# Altium footprint library tik_handheld_pcblib.PcbLib: 46 footprints (part 1 of 3)
Each footprint in its own frame and in the unit in brackets; x right, y up, seen from the top. Pads: shape width x height; smd on the part's side, far side on the other; paste and mask are expansions set on the pad; w line width, h text height; cw(c..) or ccw(c..) is an arc to the next point about the centre after c.
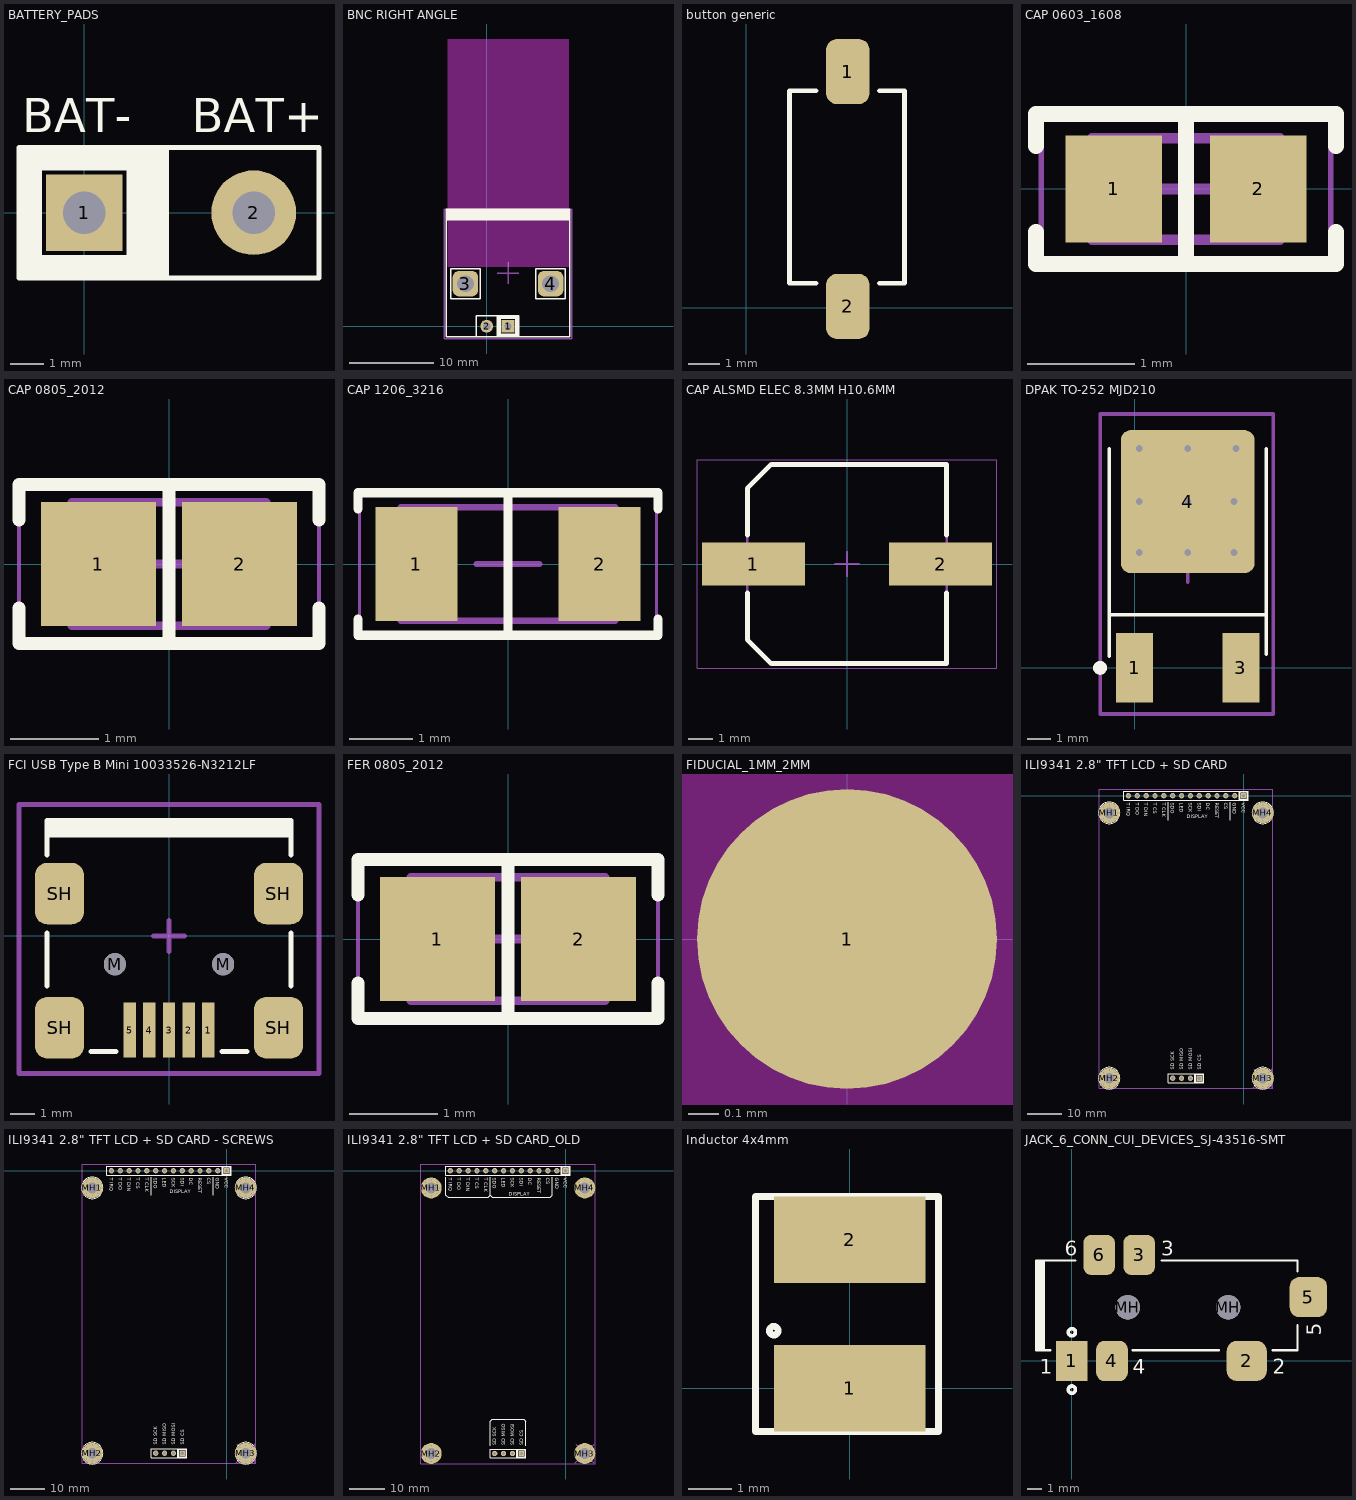
[diagram p0: the footprints below, top view; thin cyan lines are the x and y axes]

## BATTERY_PADS [mil]
pads (2):
  rect 90x90 hole 50 mask+5: 1(0,0)
  round 100 hole 50 mask+5: 2(200,0)
Top Overlay:
  rectangle: -77,-77 75,-50
  rectangle: 50,-79 100,77
  rectangle: -77,-79 -50,75
  rectangle: -77,50 75,77
  lines w6: -77,-77 277,-77 277,77 -77,77 -77,-77
  text "BAT+" at 126.69,95.01 h40
  text "BAT-" at -73.31,95.01 h40
Bottom Overlay:
  rectangle: -77,-77 75,-50
  rectangle: 50,-79 100,77
  rectangle: -77,-79 -50,75
  rectangle: -77,50 75,77
  lines w6: -77,-77 277,-77 277,77 -77,77 -77,-77
  text "BAT+" at 273.31,95.01 h40
  text "BAT-" at 73.31,95.01 h40

## BNC RIGHT ANGLE [mil] "BNC JACK RIGHT ANGLE PCB MOUNT ZINC DIE CAST"
pads (4):
  rect 60x60 hole 35: 1(100,0)
  round 60 hole 35: 2(0,0)
  rrect50% 120x120 hole 79: 3(-100,200) 4(300,200)
Top Overlay:
  rectangle: -190,500 390,550
  rectangle: 50,34 150,50
  region: 66,-50 66,50 50,50 50,-50
  region: 134,50 134,-50 150,-50 150,50
  region: 150,-34 50,-34 50,-50 150,-50
  lines w6: -190,500 390,500 ; 50,-50 150,-50 ; 50,-50 50,50 ; 50,-50 -50,-50 -50,50 50,50 ; 50,-50 50,50 ; 50,-50 150,-50 ; 50,50 150,50 150,-50 ; -190,-50 390,-50 390,550 -190,550 -190,-50 ; -170,130 -30,130 -30,270 -170,270 -170,130 ; 230,130 370,130 370,270 230,270 230,130
Bottom Overlay:
  region: 134,50 134,-50 150,-50 150,50
  rectangle: 50,34 150,50
  region: 66,-50 66,50 50,50 50,-50
  region: 150,-34 50,-34 50,-50 150,-50
  lines w6: 50,-50 -50,-50 -50,50 50,50 ; 50,-50 50,50 ; 50,-50 150,-50 150,50 50,50 ; 50,-50 50,50 ; -170,130 -30,130 -30,270 -170,270 -170,130 ; 230,130 370,130 370,270 230,270 230,130
  text "+" at 80,-66 h40
  text "-" at -19.99,-66 h40
Keep-Out Layer:
  rectangle: -185.04,279.53 385.83,1350
Mechanical 13:
  text "BNC / CONNECTOR" at 212.8,617.82 h60
Mechanical 15:
  lines w6: 50,250 150,250 ; 100,200 100,300 ; -200,-60 400,-60 400,550 -200,550 -200,-60
3D body "31-71043_1.stp": height 514.84, standoff -185.45, extent -183.5,-47.02 383.5,1347.01

## button generic [mm] "SMD Push Buttom Tact"
pads (2):
  rrect50% 1.4x2.1 smd: 1(3.277,7.62) 2(3.277,0.051)
Top Overlay:
  lines w0.152: 2.25,0.8 1.4,0.8 1.4,7 2.25,7 ; 4.3,0.8 5.1,0.8 5.1,7 4.3,7
3D body "Tactile Switch SMD 6x3.6mm H=2.5mm RS-282G05A3-SM RT.stp": height 2.5, standoff -0.02, extent 1.477,-0.114 5.077,7.886

## CAP 0603_1608 [mm] "Chip Capacitor, 2-Leads, Body 1.60x0.80mm, IPC Medium Density"
height 0.89
pads (2):
  rect 0.9x1 smd: 1(-0.675,0) 2(0.675,0)
Top Overlay:
  lines w0.15: -1.4,-0.4 -1.4,-0.7 1.4,-0.7 1.4,-0.4 ; -1.4,0.4 -1.4,0.7 1.4,0.7 1.4,0.4 ; 0,-0.7 0,0.7
Mechanical 13:
  lines w0.1: -0.875,-0.475 -0.875,0.475 0.875,0.475 0.875,-0.475 -0.875,-0.475
Mechanical 15:
  lines w0.05: -1.35,-0.75 -1.35,0.75 1.35,0.75 1.35,-0.75 -1.35,-0.75
  lines w0.1: -0.475,0 0.475,0 ; 0,-0.475 0,0.475
3D body "0603 cap.STEP": height 0.82, standoff 0, extent -0.8,-0.412 0.8,0.412

## CAP 0805_2012 [mm] "Chip Capacitor, 2-Leads, Body 2.00x1.20mm, IPC Medium Density"
height 1.15
pads (2):
  rect 1.3x1.4 smd: 1(-0.8,0) 2(0.8,0)
Top Overlay:
  lines w0.15: -1.7,-0.5 -1.7,-0.9 1.7,-0.9 1.7,-0.5 ; -1.7,0.5 -1.7,0.9 1.7,0.9 1.7,0.5 ; 0,-0.9 0,0.9
Mechanical 13:
  lines w0.1: -1.1,-0.7 1.1,-0.7 1.1,0.7 -1.1,0.7 -1.1,-0.7
Mechanical 15:
  lines w0.05: -1.7,-0.95 1.7,-0.95 1.7,0.95 -1.7,0.95 -1.7,-0.95
  lines w0.1: -0.5,0 0.5,0 ; 0,-0.5 0,0.5
3D body "0805 cap.STEP": height 1.26, standoff -0.02, extent -1,-0.637 1,0.637

## CAP 1206_3216 [mm] "Chip Capacitor, 2-Leads, Body 3.25x1.60mm, IPC Medium Density"
height 1
pads (2):
  rect 1.3x1.8 smd: 1(-1.45,0) 2(1.45,0)
Top Overlay:
  lines w0.15: -2.375,-0.875 -2.375,-1.125 2.375,-1.125 2.375,-0.875 ; -2.375,0.875 -2.375,1.125 2.375,1.125 2.375,0.875 ; 0,-1.125 0,1.125
Mechanical 13:
  lines w0.1: -1.7,-0.9 1.7,-0.9 1.7,0.9 -1.7,0.9 -1.7,-0.9
Mechanical 15:
  lines w0.05: -2.35,-1.15 2.35,-1.15 2.35,1.15 -2.35,1.15 -2.35,-1.15
  lines w0.1: -0.5,0 0.5,0 ; 0,-0.5 0,0.5
3D body "CAP 1206-1mm.STEP": height 1, standoff 0, extent -1.6,-0.8 1.6,0.8

## CAP ALSMD ELEC 8.3MM H10.6MM [mm] "Aluminum SMD Electrolytic Capacitor, 8.30mm Land Size, 8.00mm Diameter, 10.60mm Height, 10.00mm Maximum Leads Span"
height 0.9
pads (2):
  rect 4.3x1.8 smd: 1(-3.9,0) 2(3.9,0)
Top Overlay:
  lines w0.2: -4.15,-1.2 -4.15,-3.15 -3.15,-4.15 4.15,-4.15 4.15,-1.2 ; -4.15,1.2 -4.15,3.15 -3.15,4.15 4.15,4.15 4.15,1.2
Mechanical 13:
  lines w0.1: -4.15,-3.15 -4.15,3.15 -3.15,4.15 4.15,4.15 4.15,-4.15 -3.15,-4.15 -4.15,-3.15
Mechanical 15:
  lines w0.05: -6.25,-4.35 -6.25,4.35 6.25,4.35 6.25,-4.35 -6.25,-4.35
  lines w0.1: -0.5,0 0.5,0 ; 0,-0.5 0,0.5
3D body ".STEP": height 10.6, standoff 0, extent -5,-4.15 5,4.15

## DPAK TO-252 MJD210 [mm]
pads (3):
  rect 1.6x3 smd: 1(0,0) 3(4.6,0)
  rrect15% 5.8x6.2 smd: 4(2.3,7.2)
via 2.3,7.2 diameter 0.6 hole 0.3
via 2.3,5 diameter 0.6 hole 0.3
via 0.2,5 diameter 0.6 hole 0.3
via 4.3,5 diameter 0.6 hole 0.3
via 4.3,7.2 diameter 0.6 hole 0.3
via 4.4,9.5 diameter 0.6 hole 0.3
via 2.3,9.5 diameter 0.6 hole 0.3
via 0.2,7.2 diameter 0.6 hole 0.3
via 0.2,9.5 diameter 0.6 hole 0.3
Top Overlay:
  circle w0.3: c-1.5,0 r0.15
  lines w0.152: -1.1,0.5 -1.1,9.5 ; -1.1,2.3 5.7,2.3 ; 5.7,0.6 5.7,9.5
Mechanical 15:
  lines w0.152: 1.5,4.5 3.1,4.5 ; 2.3,3.7 2.3,5.3 ; -1.5,-2 6,-2 6,11 -1.5,11 -1.5,-2
3D body "User Library-DPAK_TO-252AA.step": height 2.37, standoff -0.03, extent -1.067,-0.598 5.667,9.502

## FCI USB Type B Mini 10033526-N3212LF [mm] "USB 2.0 Type B Mini"
height 3.95
pads (11):
  rect 0.5x2.25 smd: 1(1.6,-3.826) 2(0.8,-3.826) 3(0,-3.826) 4(-0.8,-3.826) 5(-1.6,-3.826)
  round 0.9 hole 0.9 unplated: M(-2.2,-1.151) M(2.2,-1.151)
  rrect50% 2x2.5 smd: SH(-4.45,-3.731) SH(-4.45,1.719) SH(4.45,-3.731) SH(4.45,1.719)
Top Overlay:
  rectangle: -4.953,3.993 4.953,4.691
  lines w0.2: -4.953,-2.04 -4.953,0.119 ; -4.953,3.294 -4.953,4.691 4.953,4.691 4.953,3.294 ; -3.175,-4.707 -2.159,-4.707 ; 2.159,-4.707 3.175,-4.707 ; 4.953,-2.04 4.953,0.119
Mechanical 15:
  lines w0.2: -0.635,0 0.635,0 ; 0,-0.635 0,0.635 ; -6.096,-5.588 -6.096,5.334 6.096,5.334 6.096,-5.588 -6.096,-5.588
3D body "FCI USB 10033526-N3212LF.STEP": height 4.01, standoff -0.99, extent -4.95,-4.701 4.95,4.699

## FER 0805_2012 [mm] "Chip Ferrite, 2-Leads, Body 2.00x1.20mm, IPC Medium Density"
height 1.15
pads (2):
  rect 1.3x1.4 smd: 1(-0.8,0) 2(0.8,0)
Top Overlay:
  lines w0.15: -1.7,-0.5 -1.7,-0.9 1.7,-0.9 1.7,-0.5 ; -1.7,0.5 -1.7,0.9 1.7,0.9 1.7,0.5 ; 0,-0.9 0,0.9
Mechanical 13:
  lines w0.1: -1.1,-0.7 1.1,-0.7 1.1,0.7 -1.1,0.7 -1.1,-0.7
Mechanical 15:
  lines w0.05: -1.7,-0.95 1.7,-0.95 1.7,0.95 -1.7,0.95 -1.7,-0.95
  lines w0.1: -0.5,0 0.5,0 ; 0,-0.5 0,0.5
3D body "FER 0805.STEP": height 1.26, standoff -0.02, extent -1,-0.637 1,0.637

## FIDUCIAL_1MM_2MM [mm]
pads (1):
  round 1 smd mask+0.5: 1(0,0)
Top Layer keep-out:
  circle w1: c0,0 r0.5

## ILI9341 2.8" TFT LCD + SD CARD [mil]
pads (22):
  rect 60x60 hole 35: 1(0,0) 18(-500,-3188.98)
  round 60 hole 35: 2(-100,0) 3(-200,0) 4(-300,0) 5(-400,0) 6(-500,0) 7(-600,0) 8(-700,0) 9(-800,0) 10(-900,0) 11(-1000,0) 12(-1100,0) 13(-1200,0) 14(-1300,0) 15(-800,-3188.98) 16(-700,-3188.98) 17(-600,-3188.98)
  round 236.22 hole 122.05 paste+0 mask+0: MH1(-1516.14,-193.7) MH2(-1516.14,-3188.98) MH3(216.14,-3188.98) MH4(216.14,-193.7)
via 280.17,-129.67 diameter 23.62 hole 11.81
via 280.17,-257.73 diameter 23.62 hole 11.81
via 152.11,-257.73 diameter 23.62 hole 11.81
via 152.11,-129.67 diameter 23.62 hole 11.81
via 216.54,-284.25 diameter 23.62 hole 11.81
via 307.09,-193.7 diameter 23.62 hole 11.81
via 216.54,-103.15 diameter 23.62 hole 11.81
via 125.98,-193.7 diameter 23.62 hole 11.81
via -1452.11,-129.67 diameter 23.62 hole 11.81
via -1452.11,-257.73 diameter 23.62 hole 11.81
via -1580.17,-257.73 diameter 23.62 hole 11.81
via -1580.17,-129.67 diameter 23.62 hole 11.81
via -1515.75,-284.25 diameter 23.62 hole 11.81
via -1425.2,-193.7 diameter 23.62 hole 11.81
via -1515.75,-103.15 diameter 23.62 hole 11.81
via -1606.3,-193.7 diameter 23.62 hole 11.81
via -1451.72,-3124.95 diameter 23.62 hole 11.81
via -1451.72,-3253.01 diameter 23.62 hole 11.81
via -1579.78,-3253.01 diameter 23.62 hole 11.81
via -1579.78,-3124.95 diameter 23.62 hole 11.81
via -1515.35,-3279.53 diameter 23.62 hole 11.81
via -1424.8,-3188.98 diameter 23.62 hole 11.81
via -1515.35,-3098.43 diameter 23.62 hole 11.81
via -1605.91,-3188.98 diameter 23.62 hole 11.81
via 280.17,-3124.95 diameter 23.62 hole 11.81
via 280.17,-3253.01 diameter 23.62 hole 11.81
via 152.11,-3253.01 diameter 23.62 hole 11.81
via 152.11,-3124.95 diameter 23.62 hole 11.81
via 216.54,-3279.53 diameter 23.62 hole 11.81
via 307.09,-3188.98 diameter 23.62 hole 11.81
via 216.54,-3098.43 diameter 23.62 hole 11.81
via 125.98,-3188.98 diameter 23.62 hole 11.81
Top Overlay:
  circle w6: c-1516.14,-193.7 r121.66
  circle w6: c-1516.14,-3188.98 r121.66
  circle w6: c216.14,-3188.98 r121.66
  circle w6: c216.14,-193.7 r121.66
  rectangle: -550.01,-3153.98 -448.01,-3136.98
  rectangle: -550.01,-3240.98 -448.01,-3223.98
  region: -448.01,-3238.98 -448.01,-3136.98 -465.01,-3136.98 -465.01,-3238.98
  region: -535.01,-3238.98 -535.01,-3136.98 -550.01,-3136.98 -550.01,-3238.98
  rectangle: -50.01,35 51.99,52
  rectangle: -50.01,-52 51.99,-35
  region: 51.99,-50 51.99,52 34.99,52 34.99,-50
  region: -35.01,-50 -35.01,52 -50.01,52 -50.01,-50
  lines w6: -850,-275 -850,-75 ; -550,-3238.19 -550,-3139.76 ; -150,-275 -150,-75 ; -50,-50 -50,50 ; -1350,-50 50,-50 50,50 -1350,50 -1350,-50 ; -850,-3238.98 -450,-3238.98 -450,-3138.98 -850,-3138.98 -850,-3238.98
  text "DISPLAY" at -641.77,-252.68 h40
  text "T IRQ" at -1319.99,-80.98 h40
  text "T DO" at -1219.99,-80.98 h40
  text "T DIN" at -1119.99,-80.98 h40
  text "T CS" at -1019.99,-80.98 h40
  text "T CLK" at -919.99,-80.98 h40
  text "SDO" at -819.99,-80.98 h40
  text "LED" at -719.99,-80.98 h40
  text "SCK" at -619.99,-80.98 h40
  text "SDI" at -519.99,-80.98 h40
  text "DC" at -419.99,-80.98 h40
  text "RESET" at -319.99,-80.98 h40
  text "CS" at -219.99,-80.98 h40
  text "GND" at -119.99,-80.98 h40
  text "VCC" at -19.99,-80.98 h40
  text "SD SCK" at -779.99,-3094 h40
  text "SD MISO" at -679.99,-3094 h40
  text "SD MOSI" at -579.99,-3094 h40
  text "SD CS" at -479.99,-3094 h40
Bottom Overlay:
  circle w6: c-1516.14,-3188.98 r121.66
  circle w6: c216.14,-3188.98 r121.66
  circle w6: c216.14,-193.7 r121.66
  circle w6: c-1516.14,-193.7 r121.66
  rectangle: -550.01,-3153.98 -448.01,-3136.98
  region: -448.01,-3238.98 -448.01,-3136.98 -465.01,-3136.98 -465.01,-3238.98
  rectangle: -550.01,-3240.98 -448.01,-3223.98
  region: -535.01,-3238.98 -535.01,-3136.98 -550.01,-3136.98 -550.01,-3238.98
  rectangle: -50.01,-52 51.99,-35
  rectangle: -50.01,35 51.99,52
  region: 34.99,50 34.99,-52 51.99,-52 51.99,50
  region: -50.01,50 -50.01,-52 -35.01,-52 -35.01,50
  lines w6: -850,-275 -850,-75 ; -550,-3238.19 -550,-3139.76 ; -150,-275 -150,-75 ; -50,-50 -50,50 ; -1350,-50 50,-50 50,50 -1350,50 -1350,-50 ; -850,-3238.98 -450,-3238.98 -450,-3138.98 -850,-3138.98 -850,-3238.98
  text "VCC" at -19.99,-189.04 h40
  text "CS" at -219.99,-149.05 h40
  text "GND" at -119.99,-189.04 h40
  text "T IRQ" at -1319.99,-262.35 h40
  text "DISPLAY" at -381.85,-252.68 h40
  text "T DO" at -1219.99,-229.02 h40
  text "T DIN" at -1119.99,-262.35 h40
  text "T CS" at -1019.99,-229.02 h40
  text "T CLK" at -919.99,-269.01 h40
  text "SDO" at -819.99,-189.04 h40
  text "LED" at -719.99,-189.04 h40
  text "SCK" at -619.99,-189.04 h40
  text "SDI" at -519.99,-175.71 h40
  text "DC" at -419.99,-149.05 h40
  text "RESET" at -319.99,-269.01 h40
  text "SD MOSI" at -579.99,-2840.98 h40
  text "SD CS" at -479.99,-2907.63 h40
  text "SD SCK" at -779.99,-2867.64 h40
  text "SD MISO" at -679.99,-2834.32 h40
Assembly Notes:
  circle w6: c216.14,-3188.98 r90.55
  lines w6: 109.84,-3295.28 216.14,-3188.98 ; 114.17,-3087.01 216.14,-3188.98 ; 318.11,-3290.94 216.14,-3188.98 ; 322.44,-3082.68 216.14,-3188.98
Mechanical 13:
  text "SD CARD READER / IN THIS SIDE" at 214.37,-2125.86 h40
Mechanical 15:
  lines w6: -1631.25,-3304.09 331.25,-3304.09 331.25,75.74 -1631.25,75.74 -1631.25,-3304.09
Drill Drawing:
  circle w6: c-1516.14,-193.7 r90.55
3D body "2.8 TFT Module_mod.STEP": height 493.83, standoff -17.54, extent -1638.35,-3309.1 337.66,72.89
3D body "ROW HEADER low 5mm 1X14PIN.STEP": height 198.82, standoff -76.77, extent -1349.41,-49.8 50.59,50.2
3D body "ROW HEADER low 5mm 1X4PIN.STEP": height 198.82, standoff -76.77, extent -849.61,-3238.78 -449.61,-3138.78

## ILI9341 2.8" TFT LCD + SD CARD - SCREWS [mil]
pads (22):
  rect 60x60 hole 35: 1(0,0) 18(-500,-3188.98)
  round 60 hole 35: 2(-100,0) 3(-200,0) 4(-300,0) 5(-400,0) 6(-500,0) 7(-600,0) 8(-700,0) 9(-800,0) 10(-900,0) 11(-1000,0) 12(-1100,0) 13(-1200,0) 14(-1300,0) 15(-800,-3188.98) 16(-700,-3188.98) 17(-600,-3188.98)
  round 236.22 hole 122.05 paste+0 mask+0: MH1(-1516.14,-193.7) MH2(-1516.14,-3188.98) MH3(216.14,-3188.98) MH4(216.14,-193.7)
via 125.98,-3188.98 diameter 23.62 hole 11.81
via 216.54,-3098.43 diameter 23.62 hole 11.81
via 307.09,-3188.98 diameter 23.62 hole 11.81
via 216.54,-3279.53 diameter 23.62 hole 11.81
via 152.11,-3124.95 diameter 23.62 hole 11.81
via 152.11,-3253.01 diameter 23.62 hole 11.81
via 280.17,-3253.01 diameter 23.62 hole 11.81
via 280.17,-3124.95 diameter 23.62 hole 11.81
via -1605.91,-3188.98 diameter 23.62 hole 11.81
via -1515.35,-3098.43 diameter 23.62 hole 11.81
via -1424.8,-3188.98 diameter 23.62 hole 11.81
via -1515.35,-3279.53 diameter 23.62 hole 11.81
via -1579.78,-3124.95 diameter 23.62 hole 11.81
via -1579.78,-3253.01 diameter 23.62 hole 11.81
via -1451.72,-3253.01 diameter 23.62 hole 11.81
via -1451.72,-3124.95 diameter 23.62 hole 11.81
via -1606.3,-193.7 diameter 23.62 hole 11.81
via -1515.75,-103.15 diameter 23.62 hole 11.81
via -1425.2,-193.7 diameter 23.62 hole 11.81
via -1515.75,-284.25 diameter 23.62 hole 11.81
via -1580.17,-129.67 diameter 23.62 hole 11.81
via -1580.17,-257.73 diameter 23.62 hole 11.81
via -1452.11,-257.73 diameter 23.62 hole 11.81
via -1452.11,-129.67 diameter 23.62 hole 11.81
via 125.98,-193.7 diameter 23.62 hole 11.81
via 216.54,-103.15 diameter 23.62 hole 11.81
via 307.09,-193.7 diameter 23.62 hole 11.81
via 216.54,-284.25 diameter 23.62 hole 11.81
via 152.11,-129.67 diameter 23.62 hole 11.81
via 152.11,-257.73 diameter 23.62 hole 11.81
via 280.17,-257.73 diameter 23.62 hole 11.81
via 280.17,-129.67 diameter 23.62 hole 11.81
Top Overlay:
  circle w6: c216.14,-193.7 r121.66
  circle w6: c216.14,-3188.98 r121.66
  circle w6: c-1516.14,-3188.98 r121.66
  circle w6: c-1516.14,-193.7 r121.66
  region: -35.01,-50 -35.01,52 -50.01,52 -50.01,-50
  region: 51.99,-50 51.99,52 34.99,52 34.99,-50
  rectangle: -50.01,-52 51.99,-35
  rectangle: -50.01,35 51.99,52
  region: -535.01,-3238.98 -535.01,-3136.98 -550.01,-3136.98 -550.01,-3238.98
  region: -448.01,-3238.98 -448.01,-3136.98 -465.01,-3136.98 -465.01,-3238.98
  rectangle: -550.01,-3240.98 -448.01,-3223.98
  rectangle: -550.01,-3153.98 -448.01,-3136.98
  lines w6: -850,-275 -850,-75 ; -550,-3238.19 -550,-3139.76 ; -150,-275 -150,-75 ; -50,-50 -50,50 ; -1350,-50 -1350,50 50,50 50,-50 -1350,-50 ; -850,-3238.98 -850,-3138.98 -450,-3138.98 -450,-3238.98 -850,-3238.98
  text "SD CS" at -479.99,-3094 h40
  text "SD MOSI" at -579.99,-3094 h40
  text "SD MISO" at -679.99,-3094 h40
  text "SD SCK" at -779.99,-3094 h40
  text "VCC" at -19.99,-80.98 h40
  text "GND" at -119.99,-80.98 h40
  text "CS" at -219.99,-80.98 h40
  text "RESET" at -319.99,-80.98 h40
  text "DC" at -419.99,-80.98 h40
  text "SDI" at -519.99,-80.98 h40
  text "SCK" at -619.99,-80.98 h40
  text "LED" at -719.99,-80.98 h40
  text "SDO" at -819.99,-80.98 h40
  text "T CLK" at -919.99,-80.98 h40
  text "T CS" at -1019.99,-80.98 h40
  text "T DIN" at -1119.99,-80.98 h40
  text "T DO" at -1219.99,-80.98 h40
  text "T IRQ" at -1319.99,-80.98 h40
  text "DISPLAY" at -641.77,-252.68 h40
Bottom Overlay:
  circle w6: c-1516.14,-193.7 r121.66
  circle w6: c216.14,-193.7 r121.66
  circle w6: c216.14,-3188.98 r121.66
  circle w6: c-1516.14,-3188.98 r121.66
  region: -50.01,50 -50.01,-52 -35.01,-52 -35.01,50
  region: 34.99,50 34.99,-52 51.99,-52 51.99,50
  rectangle: -50.01,35 51.99,52
  rectangle: -50.01,-52 51.99,-35
  region: -535.01,-3238.98 -535.01,-3136.98 -550.01,-3136.98 -550.01,-3238.98
  rectangle: -550.01,-3240.98 -448.01,-3223.98
  region: -448.01,-3238.98 -448.01,-3136.98 -465.01,-3136.98 -465.01,-3238.98
  rectangle: -550.01,-3153.98 -448.01,-3136.98
  lines w6: -850,-275 -850,-75 ; -550,-3238.19 -550,-3139.76 ; -150,-275 -150,-75 ; -50,-50 -50,50 ; -1350,-50 -1350,50 50,50 50,-50 -1350,-50 ; -850,-3238.98 -850,-3138.98 -450,-3138.98 -450,-3238.98 -850,-3238.98
  text "SD MISO" at -679.99,-2834.32 h40
  text "SD SCK" at -779.99,-2867.64 h40
  text "SD CS" at -479.99,-2907.63 h40
  text "SD MOSI" at -579.99,-2840.98 h40
  text "RESET" at -319.99,-269.01 h40
  text "DC" at -419.99,-149.05 h40
  text "SDI" at -519.99,-175.71 h40
  text "SCK" at -619.99,-189.04 h40
  text "LED" at -719.99,-189.04 h40
  text "SDO" at -819.99,-189.04 h40
  text "T CLK" at -919.99,-269.01 h40
  text "T CS" at -1019.99,-229.02 h40
  text "T DIN" at -1119.99,-262.35 h40
  text "T DO" at -1219.99,-229.02 h40
  text "DISPLAY" at -381.85,-252.68 h40
  text "T IRQ" at -1319.99,-262.35 h40
  text "GND" at -119.99,-189.04 h40
  text "CS" at -219.99,-149.05 h40
  text "VCC" at -19.99,-189.04 h40
Assembly Notes:
  circle w6: c216.14,-3188.98 r90.55
  lines w6: 109.84,-3295.28 216.14,-3188.98 ; 114.17,-3087.01 216.14,-3188.98 ; 318.11,-3290.94 216.14,-3188.98 ; 322.44,-3082.68 216.14,-3188.98
Mechanical 13:
  text "SD CARD READER / IN THIS SIDE" at 214.37,-2125.86 h40
Mechanical 15:
  lines w6: -1631.25,-3304.09 -1631.25,75.74 331.25,75.74 331.25,-3304.09 -1631.25,-3304.09
Drill Drawing:
  circle w6: c-1516.14,-193.7 r90.55
3D body "F2-B-M3-Pressfit_3.STEP": height 539.96, standoff 350.98, extent -1622.34,-299.91 -1409.92,-87.48
3D body "ISO 4762 M3 x 16 - 16S.STEP": height 562.99, standoff -185.04, extent -1624.41,-301.96 -1407.87,-85.43
3D body "ROW HEADER low 5mm 1X4PIN.STEP": height 198.82, standoff -76.77, extent -849.61,-3238.78 -449.61,-3138.78
3D body "ROW HEADER low 5mm 1X14PIN.STEP": height 198.82, standoff -76.77, extent -1349.41,-49.8 50.59,50.2
3D body "2.8 TFT Module_mod.STEP": height 493.83, standoff -17.54, extent -1638.35,-3309.1 337.66,72.89
3D body "spacer_m3_7cm.STEP": height 279.53, standoff 3.94, extent -1629.79,-292.12 -1402.49,-95.27
3D body "F2-B-M3-Pressfit_3.STEP": height 539.96, standoff 350.98, extent 109.94,-3295.18 322.37,-3082.76
3D body "ISO 4762 M3 x 16 - 16S.STEP": height 562.99, standoff -185.04, extent 107.87,-3297.24 324.41,-3080.7
3D body "spacer_m3_7cm.STEP": height 279.53, standoff 3.94, extent 102.49,-3287.39 329.8,-3090.54
3D body "F2-B-M3-Pressfit_3.STEP": height 539.96, standoff 350.98, extent -1622.34,-3295.18 -1409.92,-3082.76
3D body "ISO 4762 M3 x 16 - 16S.STEP": height 562.99, standoff -185.04, extent -1624.41,-3297.24 -1407.87,-3080.7
3D body "spacer_m3_7cm.STEP": height 279.53, standoff 3.94, extent -1629.79,-3287.39 -1402.49,-3090.54
3D body "F2-B-M3-Pressfit_3.STEP": height 539.96, standoff 350.98, extent 109.94,-299.91 322.37,-87.48
3D body "ISO 4762 M3 x 16 - 16S.STEP": height 562.99, standoff -185.04, extent 107.87,-301.96 324.41,-85.43
3D body "spacer_m3_7cm.STEP": height 279.53, standoff 3.94, extent 102.49,-292.12 329.8,-95.27

## ILI9341 2.8" TFT LCD + SD CARD_OLD [mil]
pads (22):
  rect 60x60 hole 35: 1(0,0) 18(-500,-3188.98)
  round 60 hole 35: 2(-100,0) 3(-200,0) 4(-300,0) 5(-400,0) 6(-500,0) 7(-600,0) 8(-700,0) 9(-800,0) 10(-900,0) 11(-1000,0) 12(-1100,0) 13(-1200,0) 14(-1300,0) 15(-800,-3188.98) 16(-700,-3188.98) 17(-600,-3188.98)
  round 236.22 hole 122.05 paste+0 mask+0: MH1(-1516.14,-193.7) MH2(-1516.14,-3188.98) MH3(216.14,-3188.98) MH4(216.14,-193.7)
via 125.98,-3188.98 diameter 23.62 hole 11.81
via 216.54,-3098.43 diameter 23.62 hole 11.81
via 307.09,-3188.98 diameter 23.62 hole 11.81
via 216.54,-3279.53 diameter 23.62 hole 11.81
via 152.11,-3124.95 diameter 23.62 hole 11.81
via 152.11,-3253.01 diameter 23.62 hole 11.81
via 280.17,-3253.01 diameter 23.62 hole 11.81
via 280.17,-3124.95 diameter 23.62 hole 11.81
via 125.98,-193.7 diameter 23.62 hole 11.81
via 216.54,-103.15 diameter 23.62 hole 11.81
via 307.09,-193.7 diameter 23.62 hole 11.81
via 216.54,-284.25 diameter 23.62 hole 11.81
via 152.11,-129.67 diameter 23.62 hole 11.81
via 152.11,-257.73 diameter 23.62 hole 11.81
via 280.17,-257.73 diameter 23.62 hole 11.81
via 280.17,-129.67 diameter 23.62 hole 11.81
via -1605.91,-3188.98 diameter 23.62 hole 11.81
via -1515.35,-3098.43 diameter 23.62 hole 11.81
via -1424.8,-3188.98 diameter 23.62 hole 11.81
via -1515.35,-3279.53 diameter 23.62 hole 11.81
via -1579.78,-3124.95 diameter 23.62 hole 11.81
via -1579.78,-3253.01 diameter 23.62 hole 11.81
via -1451.72,-3253.01 diameter 23.62 hole 11.81
via -1451.72,-3124.95 diameter 23.62 hole 11.81
via -1606.3,-193.7 diameter 23.62 hole 11.81
via -1515.75,-103.15 diameter 23.62 hole 11.81
via -1425.2,-193.7 diameter 23.62 hole 11.81
via -1515.75,-284.25 diameter 23.62 hole 11.81
via -1580.17,-129.67 diameter 23.62 hole 11.81
via -1580.17,-257.73 diameter 23.62 hole 11.81
via -1452.11,-257.73 diameter 23.62 hole 11.81
via -1452.11,-129.67 diameter 23.62 hole 11.81
Top Overlay:
  region: -535,-3238.98 -535,-3136.98 -550,-3136.98 -550,-3238.98
  region: -448,-3238.98 -448,-3136.98 -465,-3136.98 -465,-3238.98
  rectangle: -550,-3240.98 -448,-3223.98
  rectangle: -550,-3153.98 -448,-3136.98
  region: -35,-50 -35,52 -50,52 -50,-50
  region: 52,-50 52,52 35,52 35,-50
  rectangle: -50,-52 52,-35
  rectangle: -50,35 52,52
  lines w6: -1350,-75 -1350,-275 -1325,-300 -900,-300 -875,-300 -850,-275 ; -850,-3100 -850,-2825 -825,-2800 -475,-2800 -450,-2825 -450,-3100 ; -850,-75 -850,-275 ; -550,-3238.19 -550,-3139.76 ; -150,-75 -150,-275 -175,-300 -700,-300 -825,-300 -850,-275 ; -50,-50 -50,50 ; -1350,-50 50,-50 50,50 -1350,50 -1350,-50 ; -850,-3238.98 -450,-3238.98 -450,-3138.98 -850,-3138.98 -850,-3238.98
  text "SD CS" at -479.99,-3094 h40
  text "SD MOSI" at -579.99,-3094 h40
  text "SD MISO" at -679.99,-3094 h40
  text "SD SCK" at -779.99,-3094 h40
  text "VCC" at -19.99,-80.98 h40
  text "GND" at -119.99,-80.98 h40
  text "CS" at -219.99,-80.98 h40
  text "RESET" at -319.99,-80.98 h40
  text "DC" at -419.99,-80.98 h40
  text "SDI" at -519.99,-80.98 h40
  text "SCK" at -619.99,-80.98 h40
  text "LED" at -719.99,-80.98 h40
  text "SDO" at -819.99,-80.98 h40
  text "T CLK" at -919.99,-80.98 h40
  text "T CS" at -1019.99,-80.98 h40
  text "T DIN" at -1119.99,-80.98 h40
  text "T DO" at -1219.99,-80.98 h40
  text "T IRQ" at -1319.99,-80.98 h40
  text "DISPLAY" at -641.77,-282.21 h40
Bottom Overlay:
  region: -50,50 -50,-52 -35,-52 -35,50
  region: 35,50 35,-52 52,-52 52,50
  rectangle: -50,35 52,52
  rectangle: -50,-52 52,-35
  lines w6: -1350,-75 -1350,-275 -1325,-300 -900,-300 -875,-300 -850,-275 ; -850,-3100 -850,-2825 -825,-2800 -475,-2800 -450,-2825 -450,-3100 ; -850,-75 -850,-275 ; -150,-75 -150,-275 -175,-300 -700,-300 -825,-300 -850,-275 ; -50,-50 -50,50 ; -1350,-50 50,-50 50,50 -1350,50 -1350,-50 ; -850,-3238.98 -450,-3238.98 -450,-3138.98 -850,-3138.98 -850,-3238.98
  text "SD MISO" at -679.99,-2834.32 h40
  text "SD SCK" at -779.99,-2867.64 h40
  text "SD CS" at -479.99,-2907.63 h40
  text "SD MOSI" at -579.99,-2840.98 h40
  text "RESET" at -319.99,-269.02 h40
  text "DC" at -419.99,-149.05 h40
  text "SDI" at -519.99,-175.71 h40
  text "SCK" at -619.99,-189.04 h40
  text "LED" at -719.99,-189.04 h40
  text "SDO" at -819.99,-189.04 h40
  text "T CLK" at -919.99,-269.02 h40
  text "T CS" at -1019.99,-229.03 h40
  text "T DIN" at -1119.99,-262.35 h40
  text "T DO" at -1219.99,-229.03 h40
  text "DISPLAY" at -381.85,-282.21 h40
  text "T IRQ" at -1319.99,-262.35 h40
  text "GND" at -119.99,-189.04 h40
  text "CS" at -219.99,-149.05 h40
  text "VCC" at -19.99,-189.04 h40
Assembly Notes:
  circle w6: c216.14,-3188.98 r90.55
  lines w6: 109.84,-3295.28 216.14,-3188.98 ; 114.17,-3087.01 216.14,-3188.98 ; 318.11,-3290.94 216.14,-3188.98 ; 322.44,-3082.68 216.14,-3188.98
Mechanical 13:
  text "SD CARD READER / IN THIS SIDE" at 214.37,-2125.86 h40
Mechanical 15:
  lines w6: -1631.25,-3304.09 331.25,-3304.09 331.25,75.74 -1631.25,75.74 -1631.25,-3304.09
Drill Drawing:
  circle w6: c-1516.14,-193.7 r90.55
3D body "M3_8_SCREW_PHILIPS.STEP": height 251.97, standoff -155.68, extent -1626.38,-303.93 -1405.91,-83.46
3D body "M3_8_SCREW_PHILIPS.STEP": height 251.97, standoff -155.68, extent 105.9,-303.93 326.38,-83.46
3D body "M3_8_SCREW_PHILIPS.STEP": height 251.97, standoff -155.68, extent 105.9,-3299.21 326.38,-3078.73
3D body "M3_8_SCREW_PHILIPS.STEP": height 251.97, standoff -155.68, extent -1626.38,-3299.21 -1405.91,-3078.73
3D body "M3_NUT.STEP": height 610.24, standoff 515.75, extent -1641.16,-3297.24 -1391.12,-3080.7
3D body "M3_NUT.STEP": height 582.68, standoff 488.19, extent 91.13,-3297.24 341.16,-3080.7
3D body "M3_NUT.STEP": height 582.68, standoff 488.19, extent 91.12,-301.97 341.16,-85.43
3D body "M3_NUT.STEP": height 582.68, standoff 488.19, extent -1641.16,-301.96 -1391.12,-85.43
3D body "ROW HEADER 1X04PIN.STEP": height 337.01, standoff -76.77, extent -849.61,-3238.78 -449.61,-3138.78
3D body "ROW HEADER 1X14PIN.STEP": height 337.01, standoff -76.77, extent -1349.41,-49.8 50.59,50.2
3D body "Standoff mf - M3 x 10 across flats 5mm.step": height 712.6, standoff 3.94, extent -1629.79,-3287.4 -1402.49,-3090.54
3D body "Standoff mf - M3 x 10 across flats 5mm.step": height 712.6, standoff 3.94, extent 102.49,-3287.4 329.79,-3090.54
3D body "Standoff mf - M3 x 10 across flats 5mm.step": height 712.6, standoff 3.94, extent 102.49,-292.12 329.79,-95.27
3D body "Standoff mf - M3 x 10 across flats 5mm.step": height 712.6, standoff 3.94, extent -1629.79,-292.12 -1402.49,-95.27
3D body "2.8 TFT Module_mod.STEP": height 631.63, standoff 120.26, extent -1638.35,-3309.1 337.66,72.89

## Inductor 4x4mm [mm] "NR4018T2R2M Taiyo Yuden"
pads (2):
  rect 3.5x2 smd: 1(0,0) 2(0,3.425)
Top Overlay:
  circle w0.152: c-1.754,1.327 r0.102
  lines w0.152: -2.175,-1 -2.175,4.425 2.05,4.425 2.05,-1 -2.175,-1
3D body "NR4018.STEP": height 1.8, standoff 0, extent -2.051,-0.247 1.949,3.753

## JACK_6_CONN_CUI_DEVICES_SJ-43516-SMT [mm] "JACK_6_CONN_CUI_DEVICES_SJ-43516-SMT"
pads (8):
  rect 2.2x2.8 smd: 1(0,0)
  rrect50% 2.8x2.8 smd: 2(12.2,0)
  rrect50% 2.2x2.8 smd: 3(4.7,7.4) 4(2.8,0) 6(1.9,7.4)
  rrect50% 2.6x2.8 smd: 5(16.5,4.45)
  round 1.7 hole 1.7 unplated: MH(3.9,3.75) MH(10.9,3.75)
Top Overlay:
  circle w0.254: c0,2 r0.25
  circle w0.254: c0,-2 r0.25
  rectangle: -2.5,0.75 -1.875,7
  lines w0.152: -1.5,0.75 -2.5,0.75 -2.5,7 0.25,7 ; 4.25,0.75 6.25,0.75 10.25,0.75 ; 6.25,7 15.75,7 15.75,6.25 ; 14,0.75 15.75,0.75 15.75,2.5
  text "6" at -0.5,7.34 h1.02
  text "2" at 14,-0.91 h1.02
  text "5" at 17.41,1.75 h1.02
  text "3" at 6.25,7.34 h1.02
  text "4" at 4.25,-0.91 h1.02
  text "1" at -2.25,-0.91 h1.02
Bottom Overlay:
  rectangle: -2.5,0.75 -1.875,7
  lines w0.254: -1.5,0.75 -2.5,0.75 -2.5,7 0.25,7 ; 4.25,0.75 10.25,0.75 ; 6.25,7 15.75,7 15.75,6.25 ; 14,0.75 15.75,0.75 15.75,2.5
3D body "CUI_DEVICES_SJ-43516-SMT-TR.step": height 5.1, standoff -0.7, extent -2.3,-0.7 16.9,8.3